# Altium footprint library UZ_CarrierBoard.PcbLib: 91 footprints (part 2 of 6)
Each footprint in its own frame and in the unit in brackets; x right, y up, seen from the top. Pads: shape width x height; smd on the part's side, far side on the other; paste and mask are expansions set on the pad; w line width, h text height; cw(c..) or ccw(c..) is an arc to the next point about the centre after c.
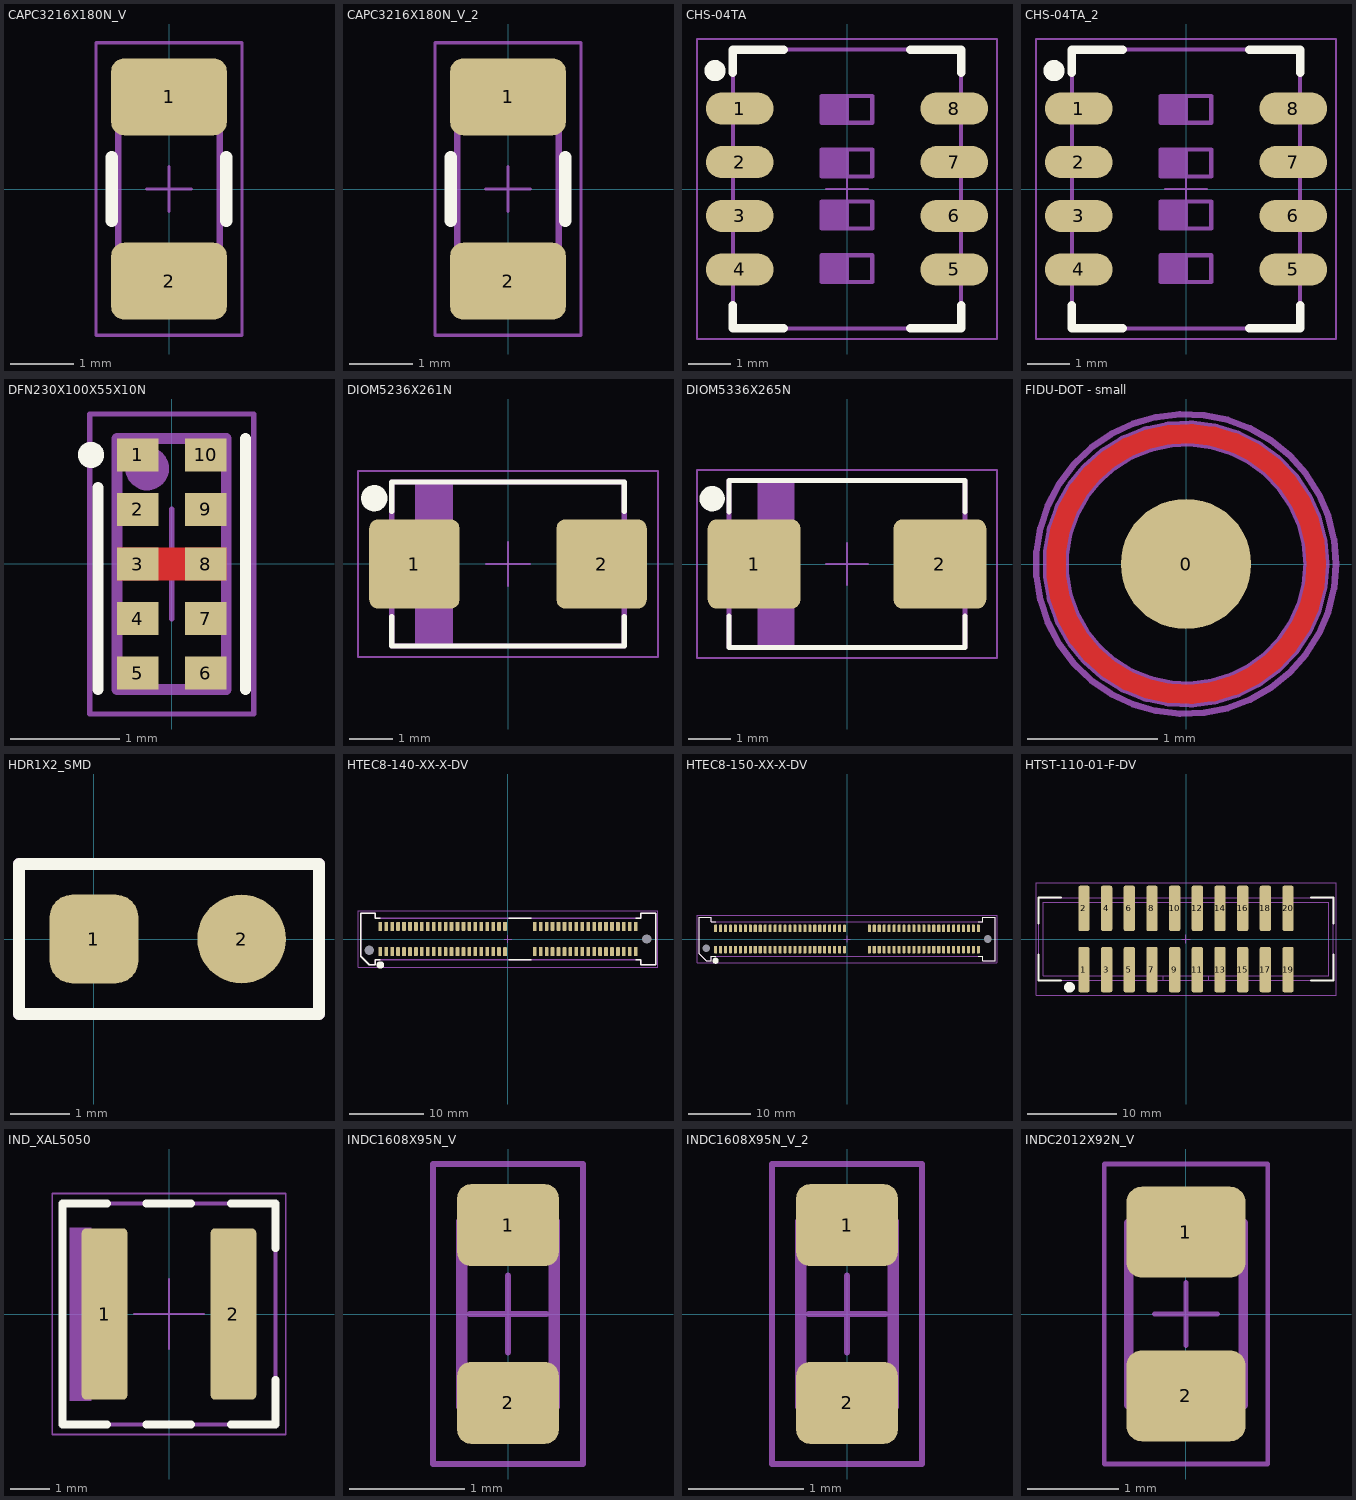
[diagram p1: the footprints below, top view; thin cyan lines are the x and y axes]

## CAPC3216X180N_V [mm]
pads (2):
  rrect33% 1.82x1.21 smd: 1(0,1.45) 2(0,-1.45)
Top Overlay:
  lines w0.2: -0.9,-0.5 -0.9,0.5 ; 0.9,-0.5 0.9,0.5
Mechanical 13:
  lines w0.1: -0.8,-1.1 0.8,-1.1 ; -0.8,1.1 0.8,1.1 ; -0.8,-1.6 0.8,-1.6 0.8,1.6 -0.8,1.6 -0.8,-1.6
  text ".Designator" at 0.35,-0.95 h0.7
Mechanical 15:
  lines w0.05: -0.35,0 0.35,0 ; 0,-0.35 0,0.35 ; -1.15,-2.3 1.15,-2.3 1.15,2.3 -1.15,2.3 -1.15,-2.3
3D body "User Library-CAPC3216X___CAPC3216X180N.STEP": height 1.82, standoff 0, extent -0.81,-1.6 0.81,1.6

## CAPC3216X180N_V_2 [mm]
pads (2):
  rrect33% 1.82x1.21 smd: 1(0,1.45) 2(0,-1.45)
Top Overlay:
  lines w0.2: -0.9,-0.5 -0.9,0.5 ; 0.9,-0.5 0.9,0.5
Mechanical 13:
  lines w0.1: -0.8,-1.1 0.8,-1.1 ; -0.8,1.1 0.8,1.1 ; -0.8,-1.6 0.8,-1.6 0.8,1.6 -0.8,1.6 -0.8,-1.6
  text ".Designator" at 1.054,1.181 h0.7
Mechanical 15:
  lines w0.05: -0.35,0 0.35,0 ; 0,-0.35 0,0.35 ; -1.15,-2.3 1.15,-2.3 1.15,2.3 -1.15,2.3 -1.15,-2.3
3D body "User Library-CAPC3216X___CAPC3216X180N.STEP": height 1.82, standoff 0, extent -0.81,-1.6 0.81,1.6

## CHS-04TA [mm]
pads (8):
  oval 1.6x0.76 smd: 1(-2.54,1.905) 2(-2.54,0.635) 3(-2.54,-0.635) 4(-2.54,-1.905) 5(2.54,-1.905) 6(2.54,-0.635) 7(2.54,0.635) 8(2.54,1.905)
Top Overlay:
  circle w0.25: c-3.125,2.8 r0.125
  lines w0.2: -2.7,-2.75 -2.7,-3.3 -1.5,-3.3 ; -2.7,2.75 -2.7,3.3 -1.5,3.3 ; 1.5,-3.3 2.7,-3.3 2.7,-2.75 ; 1.5,3.3 2.7,3.3 2.7,2.75
Mechanical 13:
  rectangle: -0.6,0.297 0,0.932
  rectangle: -0.6,1.567 0,2.202
  rectangle: -0.6,-2.203 0,-1.568
  rectangle: -0.6,-0.933 0,-0.298
  lines w0.1: -2.7,-2.105 -2.9,-2.105 -2.9,-1.705 -2.7,-1.705 ; -2.7,-0.835 -2.9,-0.835 -2.9,-0.435 -2.7,-0.435 ; -2.7,0.435 -2.9,0.435 -2.9,0.835 -2.7,0.835 ; -2.7,1.705 -2.9,1.705 -2.9,2.105 -2.7,2.105 ; 0,-2.202 0,-1.567 ; 0,-0.932 0,-0.297 ; 0,0.297 0,0.932 ; 0,1.567 0,2.202 ; 2.7,-2.105 2.9,-2.105 2.9,-1.705 2.7,-1.705 ; 2.7,-0.835 2.9,-0.835 2.9,-0.435 2.7,-0.435 ; 2.7,0.435 2.9,0.435 2.9,0.835 2.7,0.835 ; 2.7,1.705 2.9,1.705 2.9,2.105 2.7,2.105 ; -2.7,-3.3 -2.7,3.3 2.7,3.3 2.7,-3.3 -2.7,-3.3 ; -0.6,-2.202 -0.6,-1.567 0.6,-1.567 0.6,-2.202 -0.6,-2.202 ; -0.6,-0.932 -0.6,-0.297 0.6,-0.297 0.6,-0.932 -0.6,-0.932 ; -0.6,0.297 0.6,0.297 0.6,0.932 -0.6,0.932 -0.6,0.297 ; -0.6,1.567 -0.6,2.202 0.6,2.202 0.6,1.567 -0.6,1.567
  text "4" at -2.222,-2.222 h1
  text "3" at -2.222,-0.953 h1
  text "1" at -2.222,1.567 h1
  text "2" at -2.222,0.297 h1
  text "O" at 1.587,1.567 h1
  text "N" at 1.587,0.297 h1
  text ".Designator" at -2.54,3.472 h1
Mechanical 15:
  lines w0.05: -0.5,0 0.5,0 ; 0,-0.5 0,0.5 ; -3.55,-3.55 3.55,-3.55 3.55,3.55 -3.55,3.55 -3.55,-3.55
3D body "CHS-04TA1.stp": height 2.5, standoff -0.02, extent -2.8,-3.3 2.8,3.3

## CHS-04TA_2 [mm]
pads (8):
  oval 1.6x0.76 smd: 1(-2.54,1.905) 2(-2.54,0.635) 3(-2.54,-0.635) 4(-2.54,-1.905) 5(2.54,-1.905) 6(2.54,-0.635) 7(2.54,0.635) 8(2.54,1.905)
Top Overlay:
  circle w0.25: c-3.125,2.8 r0.125
  lines w0.2: -2.7,-2.75 -2.7,-3.3 -1.5,-3.3 ; -2.7,2.75 -2.7,3.3 -1.5,3.3 ; 1.5,-3.3 2.7,-3.3 2.7,-2.75 ; 1.5,3.3 2.7,3.3 2.7,2.75
Mechanical 13:
  rectangle: -0.6,0.297 0,0.932
  rectangle: -0.6,1.567 0,2.202
  rectangle: -0.6,-2.203 0,-1.568
  rectangle: -0.6,-0.933 0,-0.298
  lines w0.1: -2.7,-2.105 -2.9,-2.105 -2.9,-1.705 -2.7,-1.705 ; -2.7,-0.835 -2.9,-0.835 -2.9,-0.435 -2.7,-0.435 ; -2.7,0.435 -2.9,0.435 -2.9,0.835 -2.7,0.835 ; -2.7,1.705 -2.9,1.705 -2.9,2.105 -2.7,2.105 ; 0,-2.202 0,-1.567 ; 0,-0.932 0,-0.297 ; 0,0.297 0,0.932 ; 0,1.567 0,2.202 ; 2.7,-2.105 2.9,-2.105 2.9,-1.705 2.7,-1.705 ; 2.7,-0.835 2.9,-0.835 2.9,-0.435 2.7,-0.435 ; 2.7,0.435 2.9,0.435 2.9,0.835 2.7,0.835 ; 2.7,1.705 2.9,1.705 2.9,2.105 2.7,2.105 ; -2.7,-3.3 -2.7,3.3 2.7,3.3 2.7,-3.3 -2.7,-3.3 ; -0.6,-2.202 -0.6,-1.567 0.6,-1.567 0.6,-2.202 -0.6,-2.202 ; -0.6,-0.932 -0.6,-0.297 0.6,-0.297 0.6,-0.932 -0.6,-0.932 ; -0.6,0.297 0.6,0.297 0.6,0.932 -0.6,0.932 -0.6,0.297 ; -0.6,1.567 -0.6,2.202 0.6,2.202 0.6,1.567 -0.6,1.567
  text "4" at -2.222,-2.222 h1
  text "3" at -2.222,-0.953 h1
  text "1" at -2.222,1.567 h1
  text "2" at -2.222,0.297 h1
  text "O" at 1.587,1.567 h1
  text "N" at 1.587,0.297 h1
  text ".Designator" at -2.54,3.472 h1
Mechanical 15:
  lines w0.05: -0.5,0 0.5,0 ; 0,-0.5 0,0.5 ; -3.55,-3.55 3.55,-3.55 3.55,3.55 -3.55,3.55 -3.55,-3.55
3D body "CHS-04TA1.stp": height 2.5, standoff -0.02, extent -2.8,-3.3 2.8,3.3

## DFN230X100X55X10N [mm]
pads (10):
  rect 0.38x0.3 smd: 1(-0.31,1) 2(-0.31,0.5) 3(-0.31,0) 4(-0.31,-0.5) 5(-0.31,-1) 6(0.31,-1) 7(0.31,-0.5) 8(0.31,0) 9(0.31,0.5) 10(0.31,1)
Top Layer:
  region: -0.5,0.15 -0.5,-0.15 0.5,-0.15 0.5,0.15
Top Overlay:
  circle w0.12: c-0.74,1 r0.06
  lines w0.1: -0.675,-1.15 -0.675,0.7 ; 0.675,1.15 0.675,-1.15
Mechanical 13:
  circle w0.2: c-0.225,0.875 r0.1
  lines w0.1: -0.5,-1.15 0.5,-1.15 0.5,1.15 -0.5,1.15 -0.5,-1.15
  text ".Designator" at 1,1 h0.7
Mechanical 15:
  lines w0.05: -0.5,0 0.5,0 ; 0,-0.5 0,0.5 ; -0.75,-1.375 -0.75,1.375 0.75,1.375 0.75,-1.375 -0.75,-1.375
3D body: height 0.55, standoff 0, extent -0.5,-1.15 0.5,1.15
3D body: height 0.56, standoff 0.54, extent -0.424,0.675 -0.024,1.075

## DIOM5236X261N [mm]
pads (2):
  rrect20% 2.06x2.04 smd: 1(-2.135,0) 2(2.135,0)
Top Overlay:
  circle w0.3: c-3.05,1.5 r0.15
  lines w0.12: -2.65,-1.2 -2.65,-1.87 2.65,-1.87 2.65,-1.2 ; -2.65,1.2 -2.65,1.87 2.65,1.87 2.65,1.2
Mechanical 13:
  rectangle: -2.125,-1.875 -1.25,1.875
  lines w0.12: -2.65,-1.87 2.65,-1.87 2.65,1.87 -2.65,1.87 -2.65,-1.87
  text ".Designator" at 1.956,0.584 h1
Mechanical 15:
  lines w0.05: -0.5,0 0.5,0 ; 0,-0.5 0,0.5 ; -3.42,-2.12 3.42,-2.12 3.42,2.12 -3.42,2.12 -3.42,-2.12
3D body "User Library-DO-214AA_SMB.STEP": height 2.2, standoff -0.05, extent -2.65,-1.85 2.65,1.85

## DIOM5336X265N [mm]
pads (2):
  rrect20% 2.2x2.12 smd: 1(-2.205,0) 2(2.205,0)
Top Overlay:
  circle w0.3: c-3.2,1.55 r0.15
  lines w0.12: -2.8,-1.24 -2.8,-1.98 2.8,-1.98 2.8,-1.24 ; -2.8,1.24 -2.8,1.98 2.8,1.98 2.8,1.24
Mechanical 13:
  rectangle: -2.125,-1.98 -1.25,1.98
  lines w0.001: -2.8,1.975 -2.8,-1.975 2.8,-1.975 2.8,1.975
  lines w0.12: -2.8,-1.98 -2.8,1.98 2.8,1.98 2.8,-1.98 -2.8,-1.98
  text ".Designator" at 2.5,0.6 h1
Mechanical 15:
  lines w0.05: -0.5,0 0.5,0 ; 0,-0.5 0,0.5 ; -3.56,-2.23 -3.56,2.23 3.56,2.23 3.56,-2.23 -3.56,-2.23
3D body "User Library-DO-214AA_SMB.STEP": height 2.2, standoff -0.05, extent -2.65,-1.85 2.65,1.85

## FIDU-DOT - small [mm]
pads (1):
  round 1 smd paste-1: 0(0,0)
Top Layer:
  circle w0.15: c0,0 r1
Top Solder:
  circle w2: c0,0 r0.1
Mechanical 11:
  circle w0.005: c0,0 r1.075
Mechanical 13:
  circle w0.2: c0,0 r1
  text ".Designator" at -0.675,-0.5 h0.7
Mechanical 15:
  circle w0.05: c0,0 r1.15
3D body: height 0.01, standoff 0, extent -0.5,-0.5 0.5,0.5

## HDR1X2_SMD [mm]
pads (2):
  rrect50% 1.5x1.5 smd: 1(0,0)
  round 1.5 smd: 2(2.5,0)
Top Overlay:
  lines w0.2: -1.27,-1.27 3.81,-1.27 3.81,1.27 -1.27,1.27 -1.27,-1.27
Mechanical 5:
  lines w0.2: -1.27,-1.27 -1.27,1.27 3.81,1.27 3.81,-1.27 -1.27,-1.27

## HTEC8-140-XX-X-DV [mm]
pads (82):
  rrect30% 0.5x1.2 smd mask+0.05: 1(-17.2,-1.7) 2(-17.2,1.7) 3(-16.4,-1.7) 4(-16.4,1.7) 5(-15.6,-1.7) 6(-15.6,1.7) 7(-14.8,-1.7) 8(-14.8,1.7) 9(-14,-1.7) 10(-14,1.7) 11(-13.2,-1.7) 12(-13.2,1.7) 13(-12.4,-1.7) 14(-12.4,1.7) 15(-11.6,-1.7) 16(-11.6,1.7) 17(-10.8,-1.7) 18(-10.8,1.7) 19(-10,-1.7) 20(-10,1.7) 21(-9.2,-1.7) 22(-9.2,1.7) 23(-8.4,-1.7) 24(-8.4,1.7) 25(-7.6,-1.7) 26(-7.6,1.7) 27(-6.8,-1.7) 28(-6.8,1.7) 29(-6,-1.7) 30(-6,1.7) 31(-5.2,-1.7) 32(-5.2,1.7) 33(-4.4,-1.7) 34(-4.4,1.7) 35(-3.6,-1.7) 36(-3.6,1.7) 37(-2.8,-1.7) 38(-2.8,1.7) 39(-2,-1.7) 40(-2,1.7) 41(-1.2,-1.7) 42(-1.2,1.7) 43(-0.4,-1.7) 44(-0.4,1.7) 45(3.6,-1.7) 46(3.6,1.7) 47(4.4,-1.7) 48(4.4,1.7) 49(5.2,-1.7) 50(5.2,1.7) 51(6,-1.7) 52(6,1.7) 53(6.8,-1.7) 54(6.8,1.7) 55(7.6,-1.7) 56(7.6,1.7) 57(8.4,-1.7) 58(8.4,1.7) 59(9.2,-1.7) 60(9.2,1.7) 61(10,-1.7) 62(10,1.7) 63(10.8,-1.7) 64(10.8,1.7) 65(11.6,-1.7) 66(11.6,1.7) 67(12.4,-1.7) 68(12.4,1.7) 69(13.2,-1.7) 70(13.2,1.7) 71(14,-1.7) 72(14,1.7) 73(14.8,-1.7) 74(14.8,1.7) 75(15.6,-1.7) 76(15.6,1.7) 77(16.4,-1.7) 78(16.4,1.7) 79(17.2,-1.7) 80(17.2,1.7)
  round 0 hole 1.27 unplated: MH1(-18.7,-1.5) MH2(18.7,0)
Top Overlay:
  circle w0.5: c-17.2,-3.5 r0.25
  lines w0.178: -17.2,-2.8 -17.9,-2.8 -17.9,-3.5 -18.7,-3.5 -19.85,-2.35 -19.85,3.5 -17.9,3.5 -17.9,2.8 -17.2,2.8 ; 0.1,-2.8 3.1,-2.8 ; 0.1,2.8 3.1,2.8 ; 17.2,-2.8 17.9,-2.8 17.9,-3.5 19.9,-3.5 19.9,3.5 ; 17.2,2.8 17.9,2.8 17.9,3.5 19.9,3.5
Mechanical 13:
  lines w0.178: -19.85,-2.35 -18.7,-3.5 -17.9,-3.5 -17.9,-2.8 17.9,-2.8 17.9,-3.5 19.9,-3.5 19.9,3.5 17.9,3.5 17.9,2.8 -17.9,2.8 -17.9,3.5 -19.85,3.5 -19.85,-2.35
  text "79" at 16.6,-2.15 h1
  text "80" at 16.35,1.1 h1
  text "46" at 2.75,1.1 h1
  text "45" at 3,-2.15 h1
  text "43" at -1,-2.15 h1
  text "44" at -1.25,1.1 h1
  text "2" at -17.55,1.1 h1
  text "1" at -17.3,-2.15 h1
  text ".Designator" at -10.677,-1.737 h1.3
Mechanical 15:
  lines w0.05: -0.5,0 0.5,0 ; 0,-0.5 0,0.5 ; -20.2,-3.8 20.2,-3.8 20.2,3.8 -20.2,3.8 -20.2,-3.8
3D body "HTEC8-140-01-L-DV.stp": height 8, standoff 0, extent -19.9,-3.5 19.9,3.5

## HTEC8-150-XX-X-DV [mm]
pads (102):
  rrect30% 0.5x1.2 smd mask+0.05: 1(-21.2,-1.7) 2(-21.2,1.7) 3(-20.4,-1.7) 4(-20.4,1.7) 5(-19.6,-1.7) 6(-19.6,1.7) 7(-18.8,-1.7) 8(-18.8,1.7) 9(-18,-1.7) 10(-18,1.7) 11(-17.2,-1.7) 12(-17.2,1.7) 13(-16.4,-1.7) 14(-16.4,1.7) 15(-15.6,-1.7) 16(-15.6,1.7) 17(-14.8,-1.7) 18(-14.8,1.7) 19(-14,-1.7) 20(-14,1.7) 21(-13.2,-1.7) 22(-13.2,1.7) 23(-12.4,-1.7) 24(-12.4,1.7) 25(-11.6,-1.7) 26(-11.6,1.7) 27(-10.8,-1.7) 28(-10.8,1.7) 29(-10,-1.7) 30(-10,1.7) 31(-9.2,-1.7) 32(-9.2,1.7) 33(-8.4,-1.7) 34(-8.4,1.7) 35(-7.6,-1.7) 36(-7.6,1.7) 37(-6.8,-1.7) 38(-6.8,1.7) 39(-6,-1.7) 40(-6,1.7) 41(-5.2,-1.7) 42(-5.2,1.7) 43(-4.4,-1.7) 44(-4.4,1.7) 45(-3.6,-1.7) 46(-3.6,1.7) 47(-2.8,-1.7) 48(-2.8,1.7) 49(-2,-1.7) 50(-2,1.7) 51(-1.2,-1.7) 52(-1.2,1.7) 53(-0.4,-1.7) 54(-0.4,1.7) 55(3.6,-1.7) 56(3.6,1.7) 57(4.4,-1.7) 58(4.4,1.7) 59(5.2,-1.7) 60(5.2,1.7) 61(6,-1.7) 62(6,1.7) 63(6.8,-1.7) 64(6.8,1.7) 65(7.6,-1.7) 66(7.6,1.7) 67(8.4,-1.7) 68(8.4,1.7) 69(9.2,-1.7) 70(9.2,1.7) 71(10,-1.7) 72(10,1.7) 73(10.8,-1.7) 74(10.8,1.7) 75(11.6,-1.7) 76(11.6,1.7) 77(12.4,-1.7) 78(12.4,1.7) 79(13.2,-1.7) 80(13.2,1.7) 81(14,-1.7) 82(14,1.7) 83(14.8,-1.7) 84(14.8,1.7) 85(15.6,-1.7) 86(15.6,1.7) 87(16.4,-1.7) 88(16.4,1.7) 89(17.2,-1.7) 90(17.2,1.7) 91(18,-1.7) 92(18,1.7) 93(18.8,-1.7) 94(18.8,1.7) 95(19.6,-1.7) 96(19.6,1.7) 97(20.4,-1.7) 98(20.4,1.7) 99(21.2,-1.7) 100(21.2,1.7)
  round 0 hole 1.27 unplated: MH1(-22.7,-1.5) MH2(22.7,0)
Top Overlay:
  circle w0.5: c-21.2,-3.5 r0.25
  lines w0.178: -21.2,-2.8 -21.9,-2.8 -21.9,-3.5 -22.7,-3.5 -23.85,-2.35 -23.85,3.5 -21.9,3.5 -21.9,2.8 -21.2,2.8 ; 21.2,-2.8 21.9,-2.8 21.9,-3.5 23.9,-3.5 23.9,3.5 21.9,3.5 21.9,2.8 21.2,2.8
Mechanical 13:
  lines w0.178: -23.85,-2.35 -22.7,-3.5 -21.9,-3.5 -21.9,-2.8 21.9,-2.8 21.9,-3.5 23.9,-3.5 23.9,3.5 21.9,3.5 21.9,2.8 -21.9,2.8 -21.9,3.5 -23.85,3.5 -23.85,-2.35
  text ".Designator" at -10.763,-1.717 h1.3
  text "1" at -21.3,-2.15 h1
  text "2" at -21.55,1.1 h1
  text "54" at -1.25,1.1 h1
  text "53" at -1,-2.15 h1
  text "55" at 3,-2.15 h1
  text "56" at 2.75,1.1 h1
  text "100" at 19.85,1.1 h1
  text "99" at 20.35,-2.15 h1
Mechanical 15:
  lines w0.05: -0.5,0 0.5,0 ; 0,-0.5 0,0.5 ; -24.2,-3.8 24.2,-3.8 24.2,3.8 -24.2,3.8 -24.2,-3.8
3D body "HTEC8-150-01-L-DV.stp": height 8, standoff 0, extent -23.9,-3.5 23.9,3.5

## HTST-110-01-F-DV [mm]
pads (20):
  rrect33% 1.27x5.08 smd paste-0.076 mask+0.076: 1(-11.43,-3.43) 2(-11.43,3.43) 3(-8.89,-3.43) 4(-8.89,3.43) 5(-6.35,-3.43) 6(-6.35,3.43) 7(-3.81,-3.43) 8(-3.81,3.43) 9(-1.27,-3.43) 10(-1.27,3.43) 11(1.27,-3.43) 12(1.27,3.43) 13(3.81,-3.43) 14(3.81,3.43) 15(6.35,-3.43) 16(6.35,3.43) 17(8.89,-3.43) 18(8.89,3.43) 19(11.43,-3.43) 20(11.43,3.43)
Top Overlay:
  circle w0.6: c-13.05,-5.4 r0.3
  lines w0.2: -16.51,-1.75 -16.51,-4.635 -14,-4.635 ; -16.51,1.75 -16.51,4.635 -14,4.635 ; 14,-4.635 16.51,-4.635 16.51,-1.75 ; 14,4.635 16.51,4.635 16.51,1.75
Mechanical 13:
  lines w0.1: -2.54,-4.635 -2.54,-4.127 ; 2.54,-4.635 2.54,-4.127 ; 1.485,-1.48 1.055,-1.48 1.055,-1.05 1.485,-1.05 ; 1.485,-1.48 1.485,-1.05 ; 1.485,-1.48 1.055,-1.48 1.055,-1.05 1.485,-1.05 ; 1.485,-1.48 1.485,-1.05 ; 1.485,1.05 1.055,1.05 1.055,1.48 1.485,1.48 ; 1.485,1.05 1.485,1.48 ; 1.485,1.05 1.485,1.48 ; 1.485,1.05 1.055,1.05 1.055,1.48 1.485,1.48 ; -16.51,-4.635 16.51,-4.635 16.51,4.635 -16.51,4.635 -16.51,-4.635 ; -16.002,-4.127 -16.002,4.127 16.002,4.127 16.002,-4.127 -16.002,-4.127 ; -11.645,-1.48 -11.645,-1.05 -11.215,-1.05 -11.215,-1.48 -11.645,-1.48 ; -11.645,1.05 -11.645,1.48 -11.215,1.48 -11.215,1.05 -11.645,1.05 ; -9.105,-1.48 -9.105,-1.05 -8.675,-1.05 -8.675,-1.48 -9.105,-1.48 ; -9.105,1.05 -9.105,1.48 -8.675,1.48 -8.675,1.05 -9.105,1.05 ; -6.565,-1.48 -6.565,-1.05 -6.135,-1.05 -6.135,-1.48 -6.565,-1.48 ; -6.565,1.05 -6.565,1.48 -6.135,1.48 -6.135,1.05 -6.565,1.05 ; -4.025,-1.48 -4.025,-1.05 -3.595,-1.05 -3.595,-1.48 -4.025,-1.48 ; -4.025,1.05 -4.025,1.48 -3.595,1.48 -3.595,1.05 -4.025,1.05 ; -1.485,-1.48 -1.485,-1.05 -1.055,-1.05 -1.055,-1.48 -1.485,-1.48 ; -1.485,1.05 -1.055,1.05 -1.055,1.48 -1.485,1.48 -1.485,1.05 ; 3.595,-1.48 4.025,-1.48 4.025,-1.05 3.595,-1.05 3.595,-1.48 ; 3.595,1.05 3.595,1.48 4.025,1.48 4.025,1.05 3.595,1.05 ; 6.135,-1.48 6.565,-1.48 6.565,-1.05 6.135,-1.05 6.135,-1.48 ; 6.135,1.05 6.135,1.48 6.565,1.48 6.565,1.05 6.135,1.05 ; 8.675,-1.48 9.105,-1.48 9.105,-1.05 8.675,-1.05 8.675,-1.48 ; 8.675,1.05 8.675,1.48 9.105,1.48 9.105,1.05 8.675,1.05 ; 11.215,-1.48 11.645,-1.48 11.645,-1.05 11.215,-1.05 11.215,-1.48 ; 11.215,1.05 11.215,1.48 11.645,1.48 11.645,1.05 11.215,1.05
  text ".Designator" at 0.79,0.4 h1
  text "1" at -11.547,-2.8 h0.7
  text "19" at 10.95,-2.8 h0.7
  text "2" at -11.664,2.25 h0.7
  text "20" at 10.95,2.35 h0.7
Mechanical 15:
  lines w0.05: -0.5,0 0.5,0 ; 0,-0.5 0,0.5 ; -16.8,-6.3 16.8,-6.3 16.8,6.3 -16.8,6.3 -16.8,-6.3
3D body "HTST-110-01-F-DV.stp": height 10.19, standoff 0.03, extent -16.51,-5.588 16.51,5.588

## IND_XAL5050 [mm]
pads (2):
  rrect20% 1.18x4.4 smd: 1(-1.655,0) 2(1.655,0)
Top Overlay:
  lines w0.2: -1.59,-2.84 -2.74,-2.84 -2.74,2.84 -1.59,2.84 ; -0.585,-2.84 0.565,-2.84 ; -0.585,2.84 0.565,2.84 ; 1.59,-2.84 2.74,-2.84 2.74,-1.69 ; 1.59,2.84 2.74,2.84 2.74,1.69
Mechanical 13:
  rectangle: -2.56,-2.24 -1.99,2.22
  lines w0.1: -2.74,-2.84 -2.74,2.84 2.74,2.84 2.74,-2.84 -2.74,-2.84
  text ".Designator" at -0.5,2 h1
Mechanical 15:
  lines w0.05: -0.9,0 0,0 ; 0,-0.9 0,0 ; 0,0.9 0,0 ; 0.9,0 0,0 ; -3,-3.1 -3,3.1 3,3.1 3,-3.1 -3,-3.1
3D body "Coilcraft-XAL5050-153.step": height 5.1, standoff 0, extent -2.74,-2.84 2.74,2.84

## INDC1608X95N_V [mm]
pads (2):
  rrect33% 0.88x0.71 smd: 1(0,0.77) 2(0,-0.77)
Mechanical 13:
  lines w0.1: -0.4,-0.5 0.4,-0.5 ; -0.4,0.5 0.4,0.5 ; -0.4,-0.8 -0.4,0.8 0.4,0.8 0.4,-0.8 -0.4,-0.8
  text ".Designator" at 0.659,0.764 h0.7
Mechanical 15:
  lines w0.05: -0.333,0 0.333,0 ; 0,-0.333 0,0.333 ; -0.65,-1.3 -0.65,1.3 0.65,1.3 0.65,-1.3 -0.65,-1.3
3D body "ASMPH-0603.STEP": height 0.8, standoff 0, extent -0.4,-0.8 0.4,0.8
3D body "ASMPH-0603.STEP": height 0.95, standoff 0.15, extent -0.4,-0.8 0.4,0.8

## INDC1608X95N_V_2 [mm]
pads (2):
  rrect33% 0.88x0.71 smd: 1(0,0.77) 2(0,-0.77)
Mechanical 13:
  lines w0.1: -0.4,-0.5 0.4,-0.5 ; -0.4,0.5 0.4,0.5 ; -0.4,-0.8 0.4,-0.8 0.4,0.8 -0.4,0.8 -0.4,-0.8
  text ".Designator" at 0.4,1 h0.7
Mechanical 15:
  lines w0.05: -0.333,0 0.333,0 ; 0,-0.333 0,0.333 ; -0.65,-1.3 0.65,-1.3 0.65,1.3 -0.65,1.3 -0.65,-1.3
3D body "ASMPH-0603.STEP": height 0.95, standoff 0.15, extent -0.4,-0.8 0.4,0.8
3D body "ASMPH-0603.STEP": height 0.8, standoff 0, extent -0.4,-0.8 0.4,0.8

## INDC2012X92N_V [mm]
pads (2):
  rrect33% 1.31x1 smd: 1(0,0.9) 2(0,-0.9)
Mechanical 13:
  lines w0.1: -0.625,-0.6 0.63,-0.6 ; -0.625,0.6 0.625,0.6 ; -0.63,-1 -0.63,1 0.63,1 0.63,-1 -0.63,-1
  text ".Designator" at -0.949,-1.21 h0.7
Mechanical 15:
  lines w0.05: -0.35,0 0.35,0 ; 0,-0.35 0,0.35 ; -0.9,-1.65 -0.9,1.65 0.9,1.65 0.9,-1.65 -0.9,-1.65
3D body "742792040_Download_STP_WE-CBF-0805_rev1.stp": height 0.91, standoff 0.01, extent -0.6,-1 0.6,1